# Altium footprint library TarabusLibrary.PcbLib: 591 footprints (part 7 of 37)
Each footprint in its own frame and in the unit in brackets; x right, y up, seen from the top. Pads: shape width x height; smd on the part's side, far side on the other; paste and mask are expansions set on the pad; w line width, h text height; cw(c..) or ccw(c..) is an arc to the next point about the centre after c.
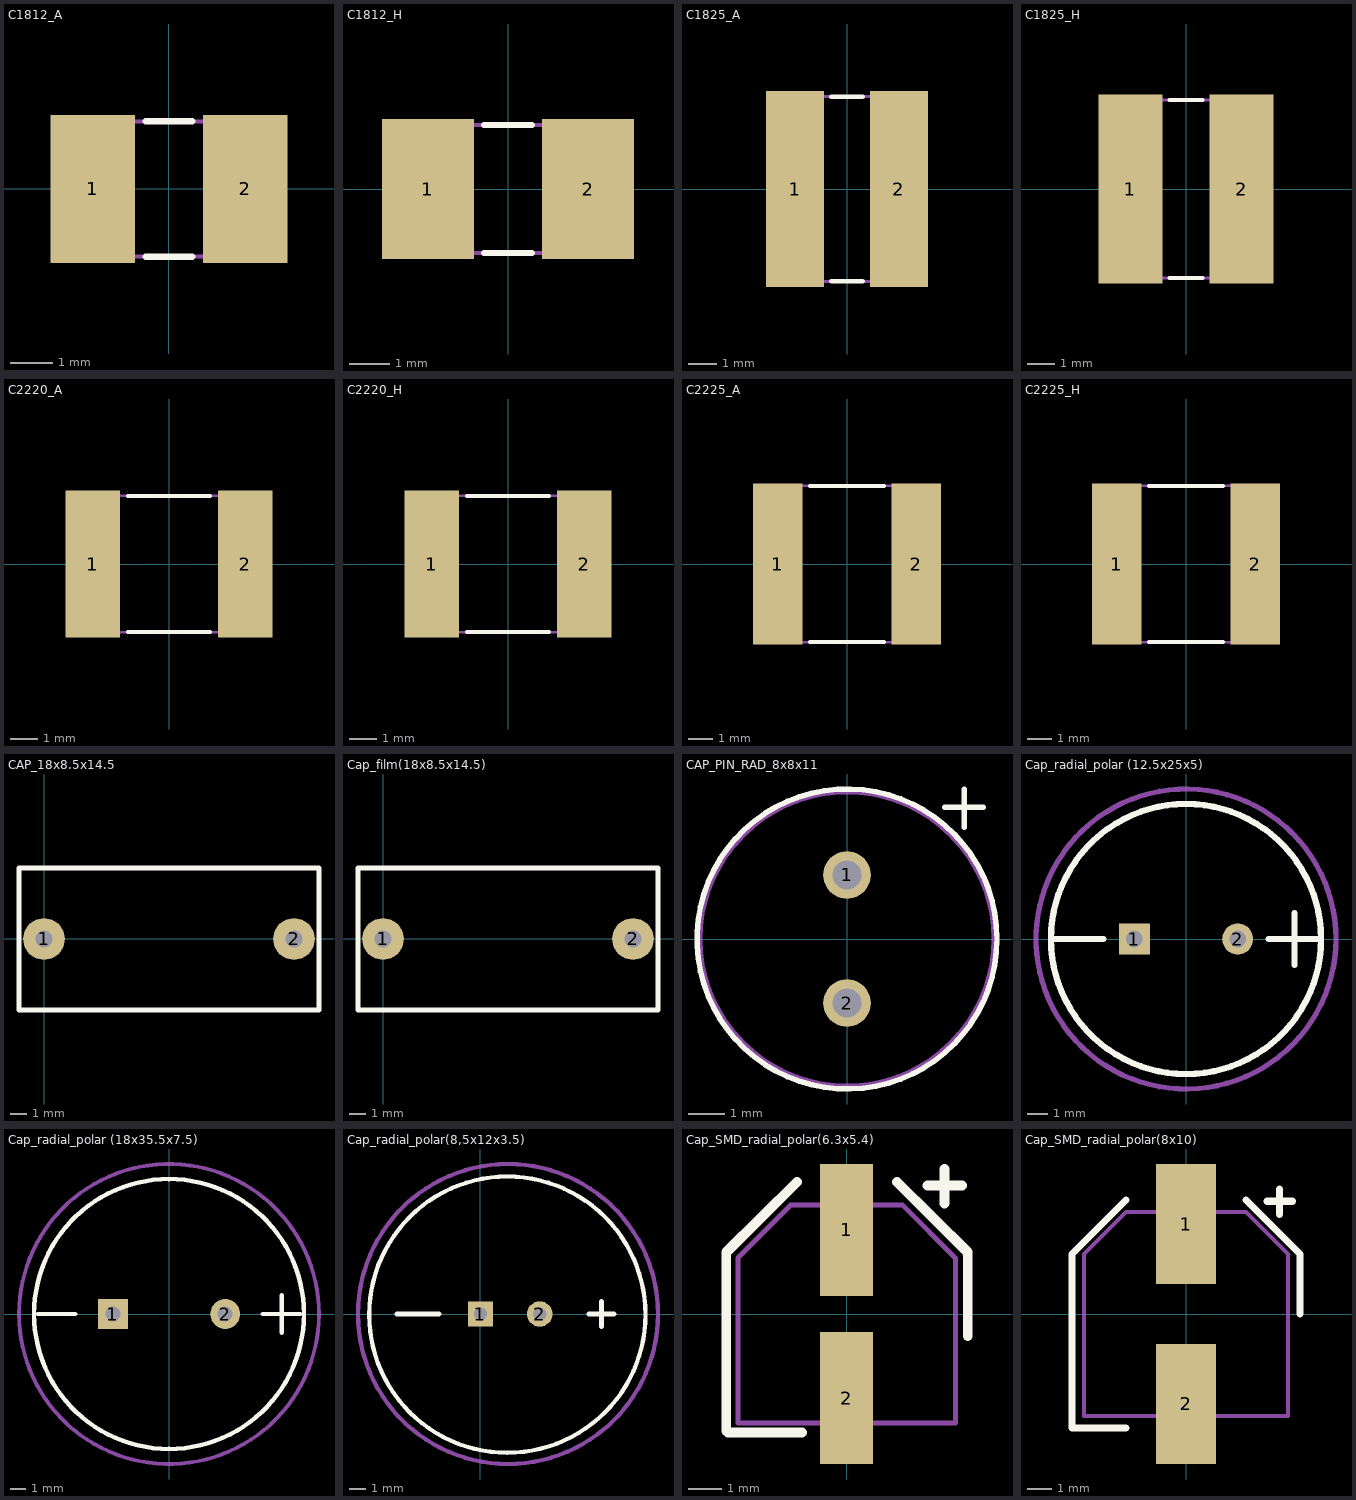
[diagram p6: the footprints below, top view; thin cyan lines are the x and y axes]

## C1812_A [mm]
height 1.7
pads (2):
  rect 2x3.5 smd: 1(-1.8,0) 2(1.8,0)
Top Overlay:
  lines w0.15: -0.55,-1.6 0.55,-1.6 ; -0.55,1.6 0.55,1.6
Mechanical 7:
  lines w0.1: -2.25,-1.6 2.25,-1.6 2.25,1.6 -2.25,1.6 -2.25,-1.6
Mechanical 10:
  text ".Comment" at -0.52,-2.51 h0.6
  text ".Designator" at -0.62,2.14 h0.8
3D body: height 1.7, standoff 0, extent -2.25,-1.6 2.25,1.6

## C1812_H [mm]
height 1.7
pads (2):
  rect 2.3x3.5 smd: 1(-2,0) 2(2,0)
Top Overlay:
  lines w0.15: -0.6,-1.6 0.6,-1.6 ; -0.6,1.6 0.6,1.6
Mechanical 7:
  lines w0.1: -2.25,-1.6 2.25,-1.6 2.25,1.6 -2.25,1.6 -2.25,-1.6
Mechanical 10:
  text ".Designator" at -0.62,2.14 h0.8
  text ".Comment" at -0.63,-2.52 h0.6
3D body: height 1.7, standoff 0, extent -2.25,-1.6 2.25,1.6

## C1825_A [mm]
height 1.7
pads (2):
  rect 2x6.8 smd: 1(-1.8,0) 2(1.8,0)
Top Overlay:
  lines w0.15: -0.55,-3.2 0.55,-3.2 ; -0.55,3.2 0.55,3.2
Mechanical 7:
  lines w0.1: -2.25,-3.2 2.25,-3.2 2.25,3.2 -2.25,3.2 -2.25,-3.2
Mechanical 10:
  text ".Designator" at -0.69,3.88 h0.8
  text ".Comment" at -0.58,-4.11 h0.6
3D body: height 1.7, standoff 0, extent -2.25,-3.2 2.25,3.2

## C1825_H [mm]
height 1.7
pads (2):
  rect 2.3x6.8 smd: 1(-2,0) 2(2,0)
Top Overlay:
  lines w0.15: -0.6,-3.2 0.6,-3.2 ; -0.6,3.2 0.6,3.2
Mechanical 7:
  lines w0.1: -2.25,-3.2 2.25,-3.2 2.25,3.2 -2.25,3.2 -2.25,-3.2
Mechanical 10:
  text ".Designator" at -0.69,3.88 h0.8
  text ".Comment" at -0.62,-4.23 h0.6
3D body: height 1.7, standoff 0, extent -2.25,-3.2 2.25,3.2

## C2220_A [mm]
height 1.8
pads (2):
  rect 2x5.4 smd: 1(-2.8,0) 2(2.8,0)
Top Overlay:
  lines w0.15: -1.5,-2.5 1.5,-2.5 ; -1.5,2.5 1.5,2.5
Mechanical 7:
  lines w0.1: -2.8,-2.5 2.8,-2.5 2.8,2.5 -2.8,2.5 -2.8,-2.5
Mechanical 10:
  text ".Comment" at -0.5,-3.49 h0.6
  text ".Designator" at -0.56,3.04 h0.8
3D body: height 1.8, standoff 0, extent -2.8,-2.5 2.8,2.5

## C2220_H [mm]
height 1.8
pads (2):
  rect 2x5.4 smd: 1(-2.8,0) 2(2.8,0)
Top Overlay:
  lines w0.15: -1.5,-2.5 1.5,-2.5 ; -1.5,2.5 1.5,2.5
Mechanical 7:
  lines w0.1: -2.8,-2.5 2.8,-2.5 2.8,2.5 -2.8,2.5 -2.8,-2.5
Mechanical 10:
  text ".Comment" at -0.47,-3.45 h0.6
  text ".Designator" at -0.56,3.04 h0.8
3D body: height 1.8, standoff 0, extent -2.8,-2.5 2.8,2.5

## C2225_A [mm]
height 2
pads (2):
  rect 2x6.5 smd: 1(-2.8,0) 2(2.8,0)
Top Overlay:
  lines w0.15: -1.5,-3.15 1.5,-3.15 ; -1.5,3.15 1.5,3.15
Mechanical 7:
  lines w0.1: -2.8,-3.15 -2.8,3.15 2.8,3.15 2.8,-3.15 -2.8,-3.15
Mechanical 10:
  text ".Comment" at -0.46,-4 h0.6
  text ".Designator" at -0.59,3.58 h0.8
3D body: height 2, standoff 0, extent -2.8,-3.15 2.8,3.15

## C2225_H [mm]
height 2
pads (2):
  rect 2x6.5 smd: 1(-2.8,0) 2(2.8,0)
Top Overlay:
  lines w0.15: -1.5,-3.15 1.5,-3.15 ; -1.5,3.15 1.5,3.15
Mechanical 7:
  lines w0.1: -2.8,-3.15 2.8,-3.15 2.8,3.15 -2.8,3.15 -2.8,-3.15
Mechanical 10:
  text ".Comment" at -0.42,-3.91 h0.6
  text ".Designator" at -0.59,3.58 h0.8
3D body: height 2, standoff 0, extent -2.8,-3.15 2.8,3.15

## CAP_18x8.5x14.5 [mm] "18x8.5x14.5"
height 14.5
pads (2):
  round 2.5 hole 1: 1(0,0) 2(15,0)
Top Overlay:
  lines w0.3: -1.5,-4.25 16.5,-4.25 16.5,4.25 -1.5,4.25 -1.5,-4.25
Mechanical 7:
  lines w0.15: -1.5,-4.25 -1.5,4.25 16.5,4.25 16.5,-4.25 -1.5,-4.25
3D body "User Library-CAP_POLY_15mm.step": height 16.3, standoff -3.7, extent -2,-4 17,4

## Cap_film(18x8.5x14.5) [mm] "18x8.5x14.5"
height 14.5
pads (2):
  round 2.5 hole 1: 1(0,0) 2(15,0)
Top Overlay:
  lines w0.3: -1.5,-4.25 -1.5,4.25 16.5,4.25 16.5,-4.25 -1.5,-4.25
Mechanical 7:
  lines w0.15: -1.5,-4.25 16.5,-4.25 16.5,4.25 -1.5,4.25 -1.5,-4.25
3D body "User Library-CAP_POLY_15mm.step": height 16.3, standoff -3.7, extent -2,-4 17,4

## CAP_PIN_RAD_8x8x11 [mm]
pads (2):
  round 1.3 hole 0.8: 1(0,1.75) 2(0,-1.75)
Top Overlay:
  circle w0.15: c0,0 r4.1
  lines w0.15: 2.675,3.6 3.725,3.6 ; 3.2,3.05 3.2,4.1
Mechanical 7:
  circle w0.1: c0,0 r4
Mechanical 9:
  circle w0.1: c0,0 r4
Mechanical 10:
  text ".Comment" at 1,-4.75 h0.6
  text ".Designator" at 0.75,4.75 h0.8
3D body: height 12, standoff 0.5, extent -3.968,-3.992 4,3.992

## Cap_radial_polar (12.5x25x5) [mm] "12.5x25x5"
height 25
pads (2):
  rect 1.5x1.5 hole 0.8: 1(-2.5,0)
  round 1.5 hole 0.8: 2(2.5,0)
Top Overlay:
  circle w0.3: c0,0 r6.53
  lines w0.3: -6.5,0 -4,0 ; 4,0 6.5,0 ; 5.25,-1.25 5.25,1.25
Mechanical 1:
  circle w0.254: c0,0 r7.25

## Cap_radial_polar (18x35.5x7.5) [mm] "18x35.5x7.5"
height 35.5
pads (2):
  rect 2x2 hole 1: 1(-3.75,0)
  round 2 hole 1: 2(3.75,0)
Top Overlay:
  circle w0.3: c0,0 r9
  lines w0.3: -8.75,0 -6.25,0 ; 6.25,0 8.75,0 ; 7.5,-1.25 7.5,1.25
Mechanical 1:
  circle w0.254: c0,0 r10

## Cap_radial_polar(8,5x12x3.5) [mil] "8,5x12x3.5"
height 472.44
pads (2):
  rect 60x60 hole 31.5: 1(0,0)
  round 60 hole 31.5: 2(140,0)
Top Overlay:
  circle w10: c63.43,-1.57 r326.27
  lines w11.81: -196.85,0 -98.43,0 ; 255.91,0 314.96,0 ; 285.43,-29.53 285.43,29.53
Mechanical 1:
  circle w10: c65,0 r354.33

## Cap_SMD_radial_polar(6.3x5.4) [mm] "6.5x5.4"
height 5.4
pads (2):
  rect 1.6x4 smd: 1(0,2.55) 2(0,-2.55)
Top Overlay:
  lines w0.3: -3.65,-3.55 -3.65,-3.05 -3.65,1.85 ; -3.65,1.875 -1.5,4 ; -3.6,-3.6 -1.35,-3.6 ; 1.525,4 3.675,1.875 ; 2.45,3.9 3.5,3.9 ; 2.975,3.35 2.975,4.4 ; 3.675,-0.675 3.675,1.85
Mechanical 7:
  lines w0.15: -3.3,-3.3 3.3,-3.3 3.3,1.7 1.7,3.3 -1.7,3.3 -3.3,1.7 -3.3,-3.3
3D body "User Library-ALU-D.STEP": height 5.4, standoff 0, extent -3.275,-3.5 3.325,3.5

## Cap_SMD_radial_polar(8x10) [mm] "8x10"
height 10
pads (2):
  rect 2.5x5 smd: 1(0,3.75) 2(0,-3.75)
Top Overlay:
  lines w0.3: -2.5,-4.75 -4.75,-4.75 -4.75,-4.25 -4.75,2.5 -2.5,4.75 ; 2.5,4.75 4.75,2.5 4.75,0 ; 3.375,4.7 4.425,4.7 ; 3.9,4.15 3.9,5.2
Mechanical 7:
  lines w0.15: -4.25,-4.25 4.25,-4.25 4.25,2.5 2.5,4.25 -2.5,4.25 -4.25,2.5 -4.25,-4.25
3D body "User Library-ALU-F.STEP": height 10.2, standoff 0, extent -4.15,-4.95 4.15,4.95